# Altium footprint library PcbLib1.PcbLib: 17 footprints (part 2 of 2)
Each footprint in its own frame and in the unit in brackets; x right, y up, seen from the top. Pads: shape width x height; smd on the part's side, far side on the other; paste and mask are expansions set on the pad; w line width, h text height; cw(c..) or ccw(c..) is an arc to the next point about the centre after c.
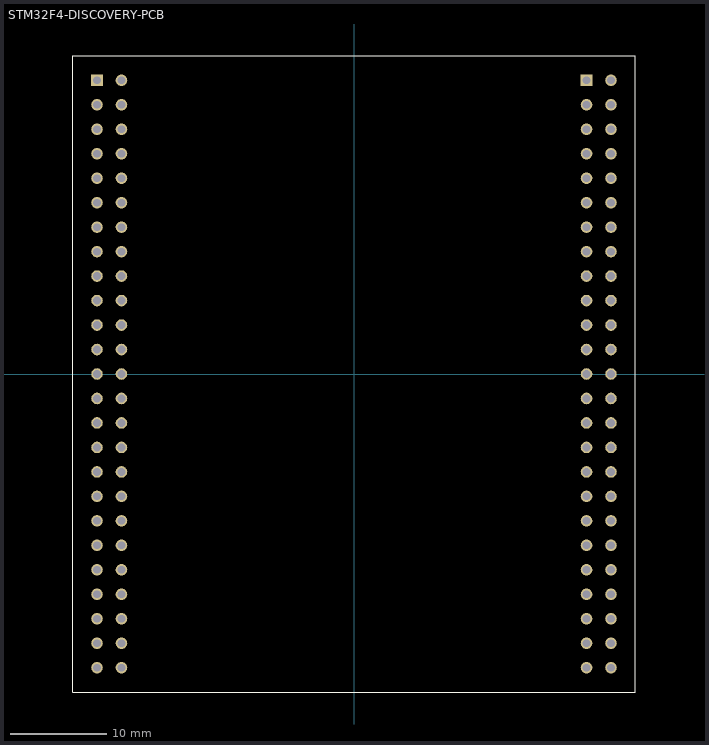
[diagram p1: the footprint, top view; thin cyan lines are the x and y axes]

## STM32F4-DISCOVERY-PCB [mil]
pads (100):
  rect 47.25x47.25 hole 31.5: P1_1(-1050,1200) P2_1(950,1200)
  round 47.25 hole 31.5: P1_2(-950,1200) P1_3(-1050,1100) P1_4(-950,1100) P1_5(-1050,1000) P1_6(-950,1000) P1_7(-1050,900) P1_8(-950,900) P1_9(-1050,800) P1_10(-950,800) P1_11(-1050,700) P1_12(-950,700) P1_13(-1050,600) P1_14(-950,600) P1_15(-1050,500) P1_16(-950,500) P1_17(-1050,400) P1_18(-950,400) P1_19(-1050,300) P1_20(-950,300) P1_21(-1050,200) P1_22(-950,200) P1_23(-1050,100) P1_24(-950,100) P1_25(-1050,0) P1_26(-950,0) P1_27(-1050,-100) P1_28(-950,-100) P1_29(-1050,-200) P1_30(-950,-200) P1_31(-1050,-300) P1_32(-950,-300) P1_33(-1050,-400) P1_34(-950,-400) P1_35(-1050,-500) P1_36(-950,-500) P1_37(-1050,-600) P1_38(-950,-600) P1_39(-1050,-700) P1_40(-950,-700) P1_41(-1050,-800) P1_42(-950,-800) P1_43(-1050,-900) P1_44(-950,-900) P1_45(-1050,-1000) P1_46(-950,-1000) P1_47(-1050,-1100) P1_48(-950,-1100) P1_49(-1050,-1200) P1_50(-950,-1200) P2_2(1050,1200) P2_3(950,1100) P2_4(1050,1100) P2_5(950,1000) P2_6(1050,1000) P2_7(950,900) P2_8(1050,900) P2_9(950,800) P2_10(1050,800) P2_11(950,700) P2_12(1050,700) P2_13(950,600) P2_14(1050,600) P2_15(950,500) P2_16(1050,500) P2_17(950,400) P2_18(1050,400) P2_19(950,300) P2_20(1050,300) P2_21(950,200) P2_22(1050,200) P2_23(950,100) P2_24(1050,100) P2_25(950,0) P2_26(1050,0) P2_27(950,-100) P2_28(1050,-100) P2_29(950,-200) P2_30(1050,-200) P2_31(950,-300) P2_32(1050,-300) P2_33(950,-400) P2_34(1050,-400) P2_35(950,-500) P2_36(1050,-500) P2_37(950,-600) P2_38(1050,-600) P2_39(950,-700) P2_40(1050,-700) P2_41(950,-800) P2_42(1050,-800) P2_43(950,-900) P2_44(1050,-900) P2_45(950,-1000) P2_46(1050,-1000) P2_47(950,-1100) P2_48(1050,-1100) P2_49(950,-1200) P2_50(1050,-1200)
Top Overlay:
  lines w5: -1150,-1300 -1150,1300 1150,1300 1150,-1300 -1150,-1300
3D body "stm30f4.SLDPRT": height 854.33, standoff -51.18, extent -1290,-1455 1288.74,2583.04